# Altium integrated library Download.IntLib: 186 symbols
Pins are listed as number, name and electrical type; pins without a type are passive.

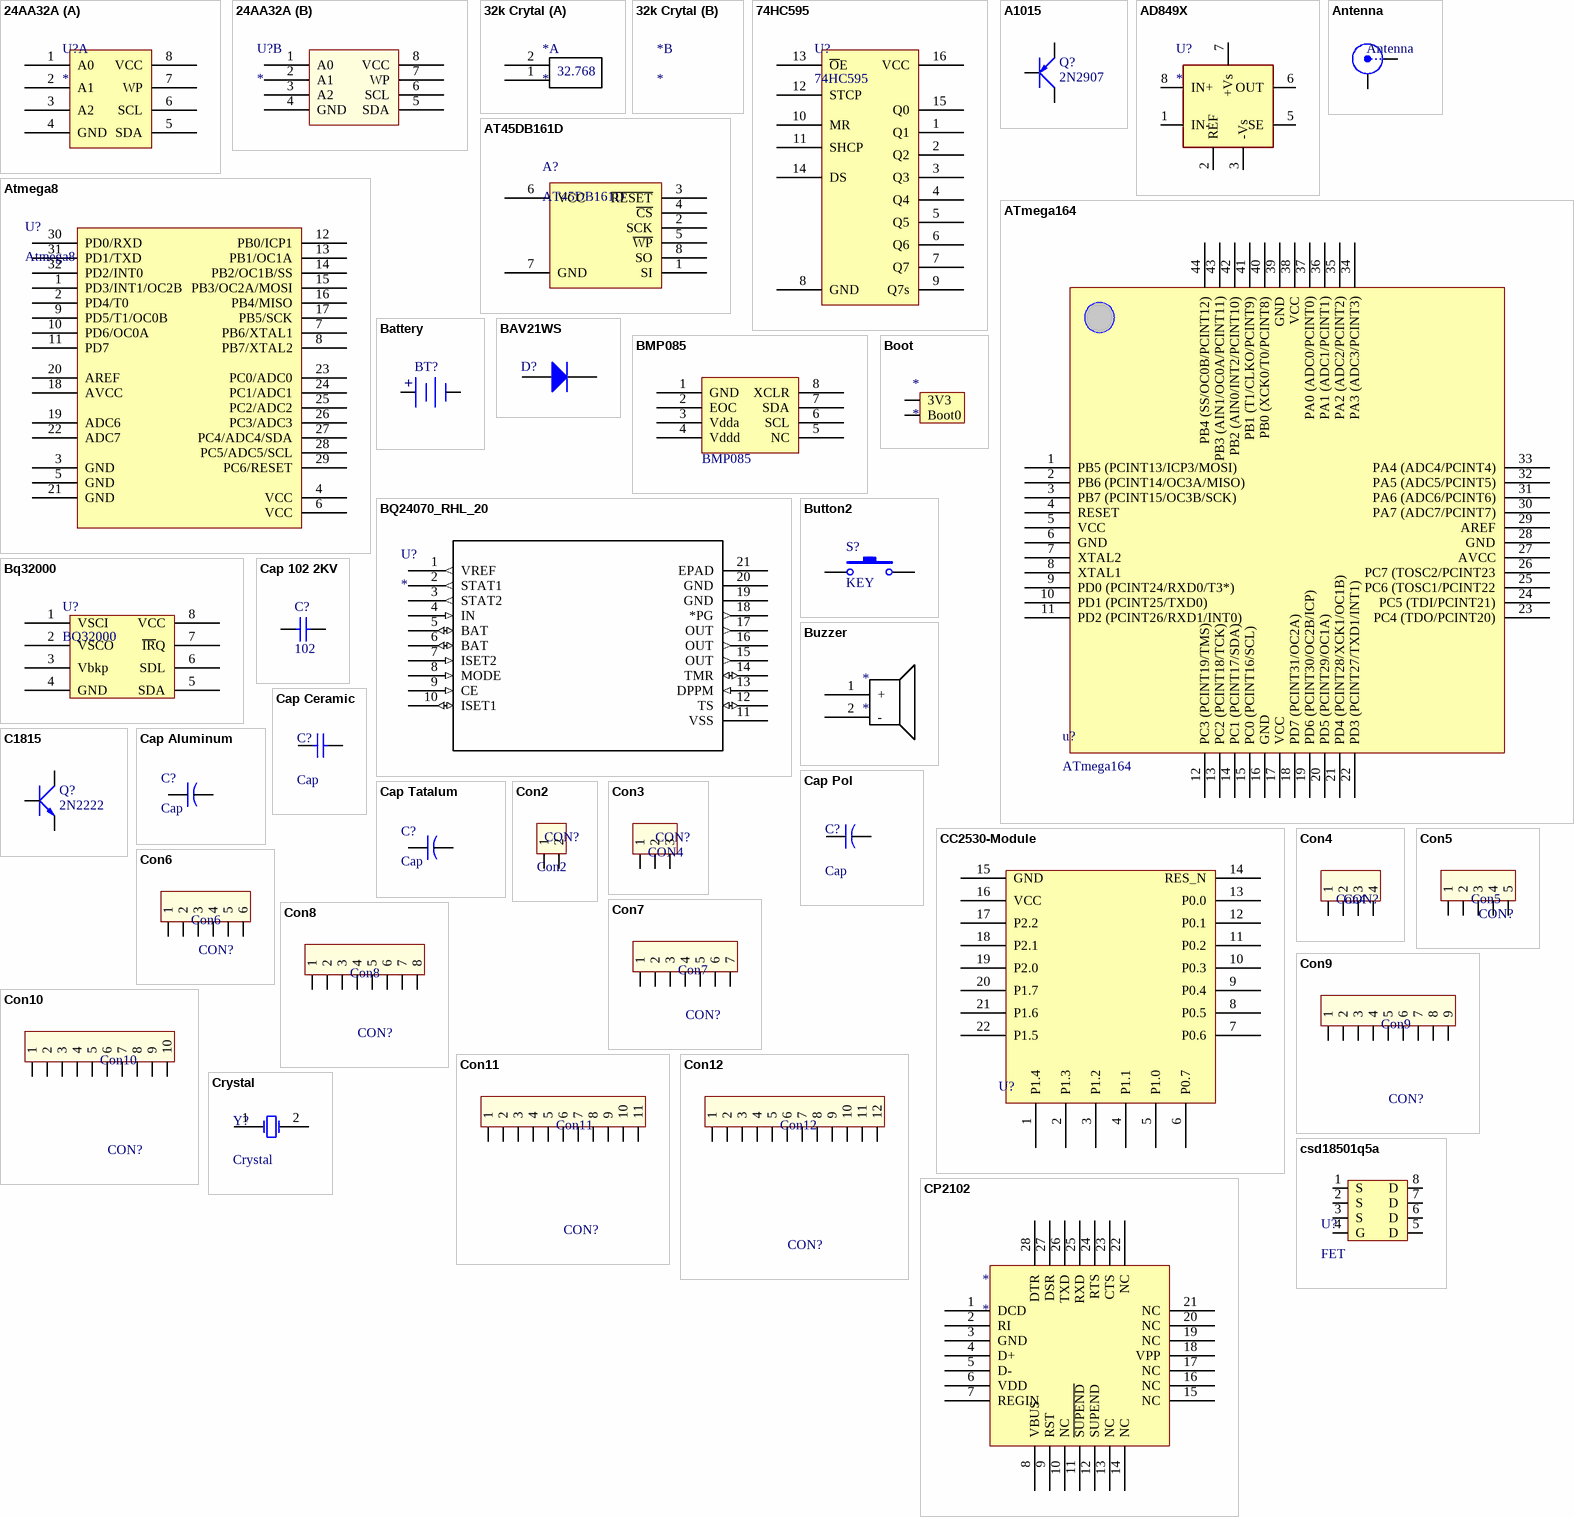
[diagram p0: symbols 24AA32A to csd18501q5a]

## 24AA32A
designator U?
part A pins: 1 A0, 2 A1, 3 A2, 4 GND, 5 SDA, 6 SCL, 7 WP, 8 VCC
part B pins: 1 A0, 2 A1, 3 A2, 4 GND, 5 SDA, 6 SCL, 7 WP, 8 VCC

## 32k Crytal
designator *
footprint 2hole_3mm
part A pins: 1, 2
part A text: 32.768

## 74HC595
designator U?
footprint SOIC16 (Small Outline; 14 Leads; Body Width 3.9 mm; Pitch 1.27 mm)
pins: 1 Q1, 2 Q2, 3 Q3, 4 Q4, 5 Q5, 6 Q6, 7 Q7, 8 GND, 9 Q7s, 10 MR, 11 SHCP, 12 STCP, 13 ~{O}E, 14 DS, 15 Q0, 16 VCC

## A1015
designator Q?, comment 2N2907
PNP 600mW, ECB; Value: A1015
footprint SOT23B (SOT 23B)
pins: 1 E, 2 C, 3 B

## AD849X
designator U?
footprint SOP8 (SOIC, 8-Leads, Body 4.9x3.9mm, Pitch 1.27mm, IPC High Density)
footprint MSOP-8
pins: 1 IN-, 2 REF, 3 -Vs, 5 SE, 6 OUT, 7 +Vs, 8 IN+

## Antenna
designator Antenna  (value not drawn)
LatestRevisionDate: 17-Jul-2002; LatestRevisionNote: Re-released for DXP Platform.; Publisher: Altium Limited
footprint IPX5 (Connector; Plug)
footprint RF_con
pins: 1 X, 2 Y

## AT45DB161D
designator A?
footprint SOIC8-8S2 (8-Pin Small Outline Integrated Circuit 1.27 mm Pitch, IPC Medium Density)
pins: 1 SI, 2 SCK, 3 ~{RESET}, 4 ~{CS}, 5 ~{WP}, 6 VCC, 7 GND, 8 SO

## Atmega8
designator U?
footprint Quad32
pins: 1 PD3/INT1/OC2B, 2 PD4/T0, 3 GND (power), 4 VCC, 5 GND (power), 6 VCC, 7 PB6/XTAL1, 8 PB7/XTAL2, 9 PD5/T1/OC0B, 10 PD6/OC0A, 11 PD7, 12 PB0/ICP1, 13 PB1/OC1A, 14 PB2/OC1B/SS, 15 PB3/OC2A/MOSI, 16 PB4/MISO, 17 PB5/SCK, 18 AVCC, 19 ADC6, 20 AREF, 21 GND (power), 22 ADC7, 23 PC0/ADC0, 24 PC1/ADC1, 25 PC2/ADC2, 26 PC3/ADC3, 27 PC4/ADC4/SDA, 28 PC5/ADC5/SCL, 29 PC6/RESET, 30 PD0/RXD, 31 PD1/TXD, 32 PD2/INT0

## ATmega164
designator u?
8-bit Atmel   Microcontroller   with   16/32/64/128K   Bytes In-System  Programmable   Flash
footprint TQFP44 (Atmega164)
pins: 1 PB5 (PCINT13/ICP3/MOSI) , 2 PB6 (PCINT14/OC3A/MISO) , 3 PB7 (PCINT15/OC3B/SCK), 4 RESET, 5 VCC, 6 GND, 7 XTAL2, 8 XTAL1, 9 PD0 (PCINT24/RXD0/T3*) , 10 PD1 (PCINT25/TXD0) , 11 PD2 (PCINT26/RXD1/INT0) , 12 PC3 (PCINT19/TMS) , 13 PC2 (PCINT18/TCK) , 14 PC1 (PCINT17/SDA), 15 PC0 (PCINT16/SCL) , 16 GND, 17 VCC, 18 PD7 (PCINT31/OC2A), 19 PD6 (PCINT30/OC2B/ICP) , 20 PD5 (PCINT29/OC1A), 21 PD4 (PCINT28/XCK1/OC1B) , 22 PD3 (PCINT27/TXD1/INT1), 23 PC4 (TDO/PCINT20), 24 PC5 (TDI/PCINT21), 25 PC6 (TOSC1/PCINT22, 26 PC7 (TOSC2/PCINT23, 27 AVCC, 28 GND, 29 AREF, 30 PA7 (ADC7/PCINT7), 31 PA6 (ADC6/PCINT6), 32 PA5 (ADC5/PCINT5), 33 PA4 (ADC4/PCINT4), 34 PA3 (ADC3/PCINT3), 35 PA2 (ADC2/PCINT2), 36 PA1 (ADC1/PCINT1), 37 PA0 (ADC0/PCINT0), 38 VCC, 39 GND, 40 PB0 (XCK0/T0/PCINT8), 41 PB1 (T1/CLKO/PCINT9), 42 PB2 (AIN0/INT2/PCINT10), 43 PB3 (AIN1/OC0A/PCINT11), 44 PB4 (SS/OC0B/PCINT12)

## Battery
designator BT?
Multicell Battery; Published: 24-Mar-1999; LatestRevisionDate: 17-Jul-2002; LatestRevisionNote: Re-released for DXP Platform.; PackageReference: BAT-2; Publisher: Altium Limited; PackageDescription: Battery; 2 Leads
footprint Battery CMOS (4.8mm)
footprint CR1220-smd (Pin)
pins: 1 -, 2 +

## BAV21WS
designator D?
Default Diode; Published: 8-Jun-2000; LatestRevisionDate: 17-Jul-2002; LatestRevisionNote: Re-released for DXP Platform.; PackageVersion: Sep-1996; PackageReference: SMC; Publisher: Altium Limited; PackageDescription: DO-214-AB/SMC; 2 C-Bend Leads; Body 7.9 x 5.9 mm, inc. leads (LxW); Code_JEDEC: DO-214-AB
footprint Diode1206
pins: 1 A, 2 K

## BMP085
designator U?
footprint BMP085
pins: 1 GND (power), 2 EOC, 3 Vdda (power), 4 Vddd (power), 5 NC, 6 SCL, 7 SDA, 8 XCLR

## Boot
designator *
footprint Boot0
pins: 1 Boot0, 2 3V3

## BQ24070_RHL_20
designator U?
Imported; Manufacturer: Texas Instruments; GENERIC_PART_NUMBER: BQ24070; INDUSTRY_STD_PKG_TYPE: QFN; FAMILY_NAME: BATTERY CHARGE MANAGEMENT; PIN_COUNT: 20; PACKAGE_DESIGNATOR: RHL; Datasheet URL: http://www.ti.com/lit/gpn/BQ24070; RefDes: RefDes; Type: DEV; Value: Value
footprint RHL20_2P05X3P05
pins: 1 VREF (out), 2 STAT1 (out), 3 STAT2 (out), 4 IN (in), 5 BAT (io), 6 BAT (io), 7 ISET2 (in), 8 MODE (in), 9 CE (in), 10 ISET1 (io), 11 VSS (power), 12 TS (io), 13 DPPM (in), 14 TMR (io), 15 OUT (out), 16 OUT (out), 17 OUT (out), 18 *PG (out), 19 GND (power), 20 GND (power), 21 EPAD

## Bq32000
designator U?, comment BQ32000
footprint SOP8 (SOIC, 8-Leads, Body 4.9x3.9mm, Pitch 1.27mm, IPC High Density)
pins: 1 VSCI, 2 VSCO, 3 Vbkp, 4 GND, 5 SDA, 6 SDL, 7 ~{IR}Q, 8 VCC

## Button2
designator S?, comment KEY
Button
footprint SW-SMD (Switch SMD type)
pins: 1, 2

## Buzzer
designator *
footprint BUZZER_12.0X8.5MM
footprint Buzzer
pins: 1 +, 2 -

## C1815
designator Q?, comment 2N2222
NPN 600mW, ECB; Value: C1815
footprint SOT23B (SOT 23B)
pins: 1 E, 2 C, 3 B

## Cap 102 2KV
designator C?, comment 102
Capacitor (Semiconductor SIM Model); Value: 0.1uF; Published: 8-Jun-2000; LatestRevisionDate: 17-Jul-2002; LatestRevisionNote: Re-released for DXP Platform.; PackageReference: C1206; Publisher: Altium Limited
footprint CAP102 2KV (Capacitor, Ceramic, Thru-Hole, Dipped Radial; Body 5.1 x 3.2 mm (WxT) Pin Spacing 2.54 mm (typ))
pins: 1, 2

## Cap Aluminum
designator C?, comment Cap
Capacitor
footprint CAP-D8-220uF/16V (6.3 x 7.7 mm)
footprint CAP-B-22UF/16V
pins: 1, 2

## Cap Ceramic
designator C?, comment Cap
Capacitor; Published: 8-Jun-2000; LatestRevisionDate: 17-Jul-2002; LatestRevisionNote: Re-released for DXP Platform.; PackageReference: RAD-0.3; Publisher: Altium Limited; PackageDescription: Radial Cap, Thru-Hole; 2 Leads; 0.3 in Pin Spacing
footprint CAP0603
footprint CAP0805
footprint CAP1206
pins: 1, 2

## Cap Pol
designator C?, comment Cap
Capacitor; Published: 23-Sep-2002; PackageReference: CAPR5-4X5; Publisher: Altium Limited; PackageDescription: Capacitor; 2 Leads
footprint CP2/5 (Tu hoa 1000uF/25V,50V)
footprint Cap-Pol 8x12
pins: 1, 2

## Cap Tatalum
designator C?, comment Cap
Capacitor
footprint CAP1812 (Chip Capacitor; Body 4.5 x 3.2 mm (LxW typ))
footprint SM-Tanta-1206
footprint CAPMP-0805-2012X150USR (Molded body capacitor, Body 2.0x1.2mm, 0805, IPC Medium Density)
footprint CAPMP-1206-3216X180N (Capacitor, polarized, Molded Body, EIA 535BAAC size A; 3.20mm L X 1.60mm W X 1.80mm H)
footprint CAPMP-1210-3528X210N (Molded body capacitor, Body 3.5x2.8mm, 1210, IPC Nominal settings)
footprint CAPMP-2312-6032X280N (Capacitor, polarized, Molded Body, EIA 535BAAC size C; 6.00mm L X 3.20mm W X 2.80mm H)
footprint CAPMP-2917-7343X310N (Molded body capacitor, Body 7.3x4.3mm, 2917, IPC Nominal settings)
pins: 1, 2

## CC2530-Module
designator U?, comment U  (value not drawn)
pins: 1 P1.4, 2 P1.3, 3 P1.2, 4 P1.1, 5 P1.0, 6 P0.7, 7 P0.6, 8 P0.5, 9 P0.4, 10 P0.3, 11 P0.2, 12 P0.1, 13 P0.0, 14 RES_N, 15 GND, 16 VCC, 17 P2.2, 18 P2.1, 19 P2.0, 20 P1.7, 21 P1.6, 22 P1.5

## Con2
designator CON?
JST B2B - CONNECTOR, HEADER, 2.5MM, 2POS, 1ROW-(JAPAN SOLDERLESS TERMINALS); Value: Connector 2
footprint CON2
footprint TERMIN SINO
pins: 1, 2

## Con3
designator CON?, comment CON4
JST B3B - CONNECTOR, HEADER, 2.5MM, 3POS, 1ROW-(JAPAN SOLDERLESS TERMINALS); Value: Connector 3
footprint CON3 (CON 3)
pins: 1, 2, 3

## Con4
designator CON?
JST B4B - CONNECTOR, HEADER, 2.5MM, 4POS, 1ROW-(JAPAN SOLDERLESS TERMINALS); Value: Connector 4
footprint CON4
pins: 1, 2, 3, 4

## Con5
designator CON?
JST B5B - CONNECTOR, HEADER, 2.5MM, 5POS, 1ROW-(JAPAN SOLDERLESS TERMINALS); Value: Connector 5
footprint CON5
pins: 1, 2, 3, 4, 5

## Con6
designator CON?
JST B6B - CONNECTOR, HEADER, 2.5MM, 6POS, 1ROW-(JAPAN SOLDERLESS TERMINALS); Value: Connector 6
footprint CON6
pins: 1, 2, 3, 4, 5, 6

## Con7
designator CON?
JST B7B - CONNECTOR, HEADER, 2.5MM, 7POS, 1ROW-(JAPAN SOLDERLESS TERMINALS); Value: Connector 7
footprint CON7
pins: 1, 2, 3, 4, 5, 6, 7

## Con8
designator CON?
JST B8B - CONNECTOR, HEADER, 2.5MM, 8POS, 1ROW-(JAPAN SOLDERLESS TERMINALS); Value: Connector 8
footprint CON8
pins: 1, 2, 3, 4, 5, 6, 7, 8

## Con9
designator CON?
JST B9B - CONNECTOR, HEADER, 2.5MM, 9POS, 1ROW-(JAPAN SOLDERLESS TERMINALS); Value: Connector 9
footprint CON9
pins: 1, 2, 3, 4, 5, 6, 7, 8, 9

## Con10
designator CON?
JST B10B - CONNECTOR, HEADER, 2.5MM, 10POS, 1ROW-(JAPAN SOLDERLESS TERMINALS); Value: Connector 10
footprint CON10
pins: 1, 2, 3, 4, 5, 6, 7, 8, 9, 10

## Con11
designator CON?
JST B11B - CONNECTOR, HEADER, 2.5MM, 11POS, 1ROW-(JAPAN SOLDERLESS TERMINALS); Value: Connector 11
footprint CON11
pins: 1, 2, 3, 4, 5, 6, 7, 8, 9, 10, 11

## Con12
designator CON?
JST B12B - CONNECTOR, HEADER, 2.5MM, 12POS, 1ROW-(JAPAN SOLDERLESS TERMINALS); Value: Connector 12
footprint CON12
pins: 1, 2, 3, 4, 5, 6, 7, 8, 9, 10, 11, 12

## CP2102
designator *
footprint CP2102 (QFN, 28-Leads, Body 4.80x4.80mm, Pitch 0.50mm, Thermal Pad 3.30x3.30mm, IPC Medium Density)
pins: 1 DCD, 2 RI, 3 GND, 4 D+, 5 D-, 6 VDD, 7 REGIN, 8 VBUS, 9 RST, 10 NC, 11 ~{SUPEND}, 12 SUPEND, 13 NC, 14 NC, 15 NC, 16 NC, 17 NC, 18 VPP, 19 NC, 20 NC, 21 NC, 22 NC, 23 CTS, 24 RTS, 25 RXD, 26 TXD, 27 DSR, 28 DTR

## Crystal
designator Y?
Crystal Oscillator; Published: 8-Jun-2000; LatestRevisionDate: 17-Jul-2002; LatestRevisionNote: Re-released for DXP Platform.; PackageReference: R38; Publisher: Altium Limited; PackageDescription: Crystal, Thru-Hole; 2 Leads; Body 3.1 x 8.2 mm (Dia.xH)
footprint CRYSTAL_XT- 16MHz
footprint CRYSTAL_XT5032-8Mhz (Crystal)
footprint CRYSTAL_NX2520SA (SMD Crystal 4-lead leadless package)
footprint CRYSTAL_HC49-US-SM (SMD Crystal HC49/US-SM package)
footprint CRYSTAL_4-LCC (SMD Crystal 4-lead leadless package)
footprint XT2 (Footpin for Crystal 2 pin)
footprint 2hole_3mm
pins: 1 OSC1, 2 OSC2

## csd18501q5a
designator U?, comment FET
footprint csd18501q5a (FET)
pins: 1 S, 2 S, 3 S, 4 G, 5 D, 6 D, 7 D, 8 D

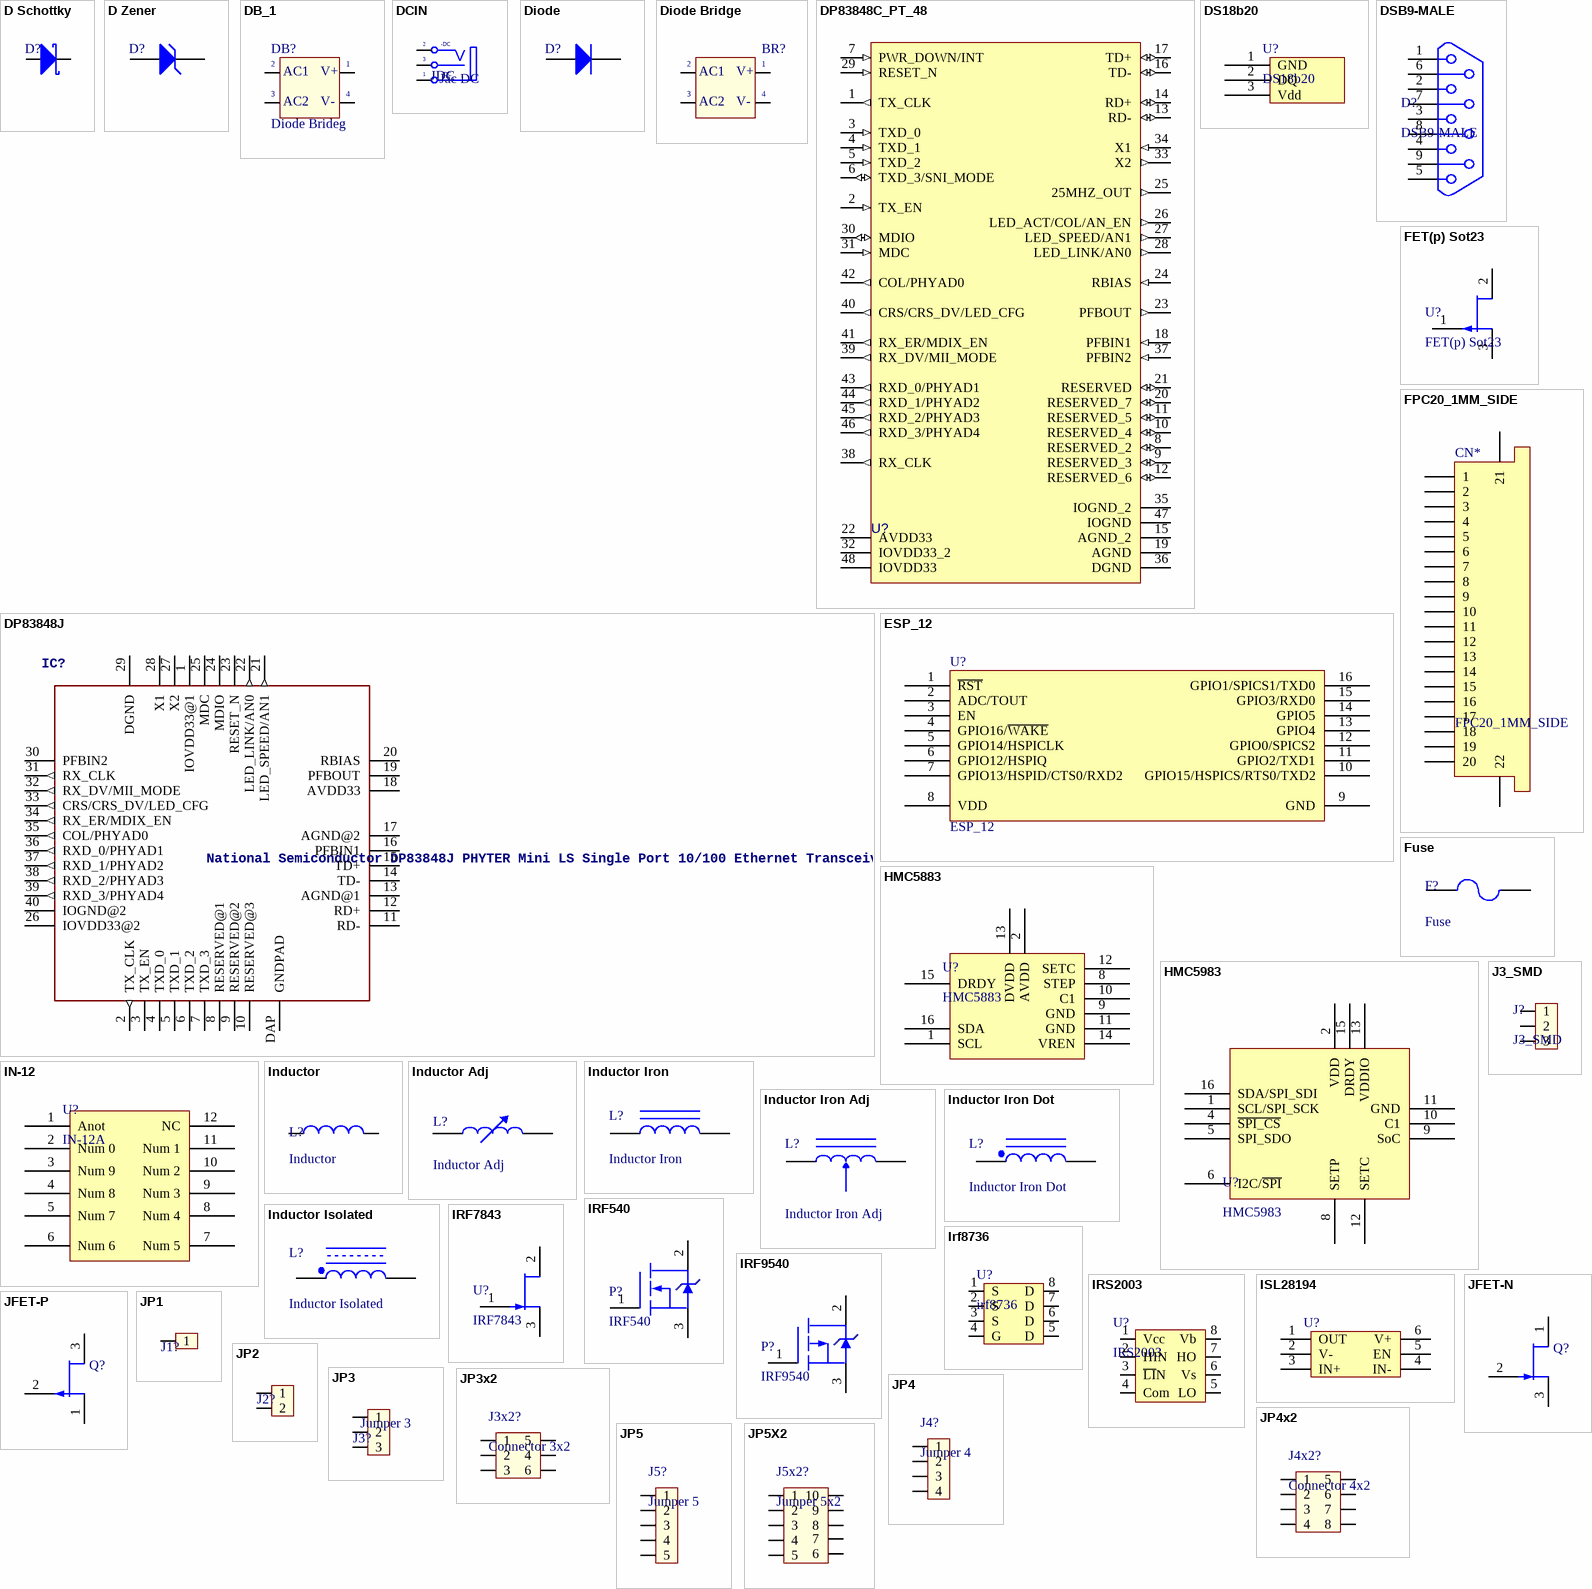
[diagram p1: symbols D Schottky to JP5X2]

## D Schottky
designator D?
Schottky Diode; Published: 8-Jun-2000; LatestRevisionDate: 17-Jul-2002; LatestRevisionNote: Re-released for DXP Platform.; PackageReference: SMB; Publisher: Altium Limited; PackageDescription: DO-214-AA/SMB; 2 C-Bend Leads; Body 5.3 x 3.6 mm, inc. leads (LxW); Code_JEDEC: DO-214-AA
footprint Diode1206
pins: 1 A, 2 K

## D Zener
designator D?
Zener Diode; Published: 8-Jun-2000; LatestRevisionDate: 17-Jul-2002; LatestRevisionNote: Re-released for DXP Platform.; PackageReference: DIODE-0.7; Publisher: Altium Limited; PackageDescription: Diode, Thru-Hole; 2 Leads; 0.7 in Pin Spacing
pins: 1 A, 2 K

## DB_1
designator DB?, comment Diode Brideg
Convert AC to DC voltage, 4 pin; Value: Cau 1A
footprint CAU 1A (CAU 1A DET)
footprint CAU 5A (CAU 5A DET)
footprint Cau 10A (CAU 10A det)
footprint CAU 1AC (CAU 1A TRON)
pins: 1 +V OUT, 2 AC1, 3 AC2, 4 -V OUT
text: V+; V-

## DCIN
designator JDC, comment Jac DC
Jac DC input; Value: Jac DC
footprint DC-IN (Jac DC input)
pins: 1 T "Tip", 2 TN "Tip Normal (Break Contact)", 3 S (power) "Sleeve (Ground)"
text: -DC; +DC

## Diode
designator D?
Default Diode; Published: 8-Jun-2000; LatestRevisionDate: 17-Jul-2002; LatestRevisionNote: Re-released for DXP Platform.; PackageVersion: Sep-1996; PackageReference: SMC; Publisher: Altium Limited; PackageDescription: DO-214-AB/SMC; 2 C-Bend Leads; Body 7.9 x 5.9 mm, inc. leads (LxW); Code_JEDEC: DO-214-AB
footprint Diode1206
footprint DIODE-M7 (Metal Electrode Face (MELF) Diode; Body 3.5 x 1.5 mm (LxDia))
footprint DO-214AC (JEDEC DO214 variation AC. SMA ( Diode M7 ))
footprint DO-214AB (JEDEC DO214 variation AB. SMC ( Diode SS34 ))
footprint DO-214AA (JEDEC DO214 variation AA. SMB)
pins: 1 A, 2 K

## Diode Bridge
designator BR?, comment BR  (value not drawn)
Convert AC to DC voltage, 4 pin; Value: Cau 1A
footprint DB 1A (CAU 1A DET)
footprint DB 1AC (CAU 1A TRON)
footprint DB 5A (CAU 5A DET)
footprint DB-S4 (SOT143, 4-Leads, Body 8.50x10.50mm, Pitch 5.20mm, IPC Medium Density)
pins: 1 +V OUT, 2 AC1, 3 AC2, 4 -V OUT
text: V+; V-

## DP83848C_PT_48
designator U?  (value not drawn)
PartNumber: DP83848CVV; Manufacturer: NationalSemiconductor; PackageTopMarking: NSUZXYTTDP83848VVVBC; PowerWise: N; CompType: InterfaceIC; ComponentLink1DescBC: DP83848CDatasheet; ComponentLink2DescA4: DP83848CWebPage; ComponentLink3DescAC: VBH48APackagePage; Published: 4-Dec-2008; DatasheetVersion: May-2008; PackageVersion: revEMay-2007; PackageReference: VBH48A; Publisher: AltiumLimited; PackageDescription: LQFP7x7x14mm48Lead05mmPitch; SUPPLIER_3: 1Farnell; SUPPLIER_2: PartNumb0C1286816; SUPPLIER_4: 2Farnell; Supplier: PartNumb0F1528379; RoHS: Y; PinCount: 48; ComponentLink1URL: http//wwwnationalcom/ds/DP/DP83848Cpdf; ComponentLink2URL: http//wwwnationalcom/pf/DP/DP83848Chtml; ComponentLink3URL: http//wwwnationalcom/packaging/folders/vbh48ahtml; Value: DP83848C_PT_48
footprint DP83848C_48 (Thin QFP, 48-Leads, Body 7x7mm, Pitch 0.5mm, IPC High Density)
pins: 1 TX_CLK (out), 2 TX_EN (in), 3 TXD_0 (in), 4 TXD_1 (in), 5 TXD_2 (in), 6 TXD_3/SNI_MODE (io), 7 PWR_DOWN/INT (in), 8 RESERVED_2 (io), 9 RESERVED_3 (io), 10 RESERVED_4 (io), 11 RESERVED_5 (io), 12 RESERVED_6 (io), 13 RD- (io), 14 RD+ (io), 15 AGND_2 (power), 16 TD- (io), 17 TD+ (io), 18 PFBIN1 (in), 19 AGND (power), 20 RESERVED_7 (io), 21 RESERVED (io), 22 AVDD33 (power), 23 PFBOUT (out), 24 RBIAS (in), 25 25MHZ_OUT (out), 26 LED_ACT/COL/AN_EN (out), 27 LED_SPEED/AN1 (out), 28 LED_LINK/AN0 (out), 29 RESET_N (in), 30 MDIO (io), 31 MDC (in), 32 IOVDD33_2 (power), 33 X2 (out), 34 X1 (in), 35 IOGND_2 (power), 36 DGND (power), 37 PFBIN2 (in), 38 RX_CLK (out), 39 RX_DV/MII_MODE (out), 40 CRS/CRS_DV/LED_CFG (out), 41 RX_ER/MDIX_EN (out), 42 COL/PHYAD0 (out), 43 RXD_0/PHYAD1 (out), 44 RXD_1/PHYAD2 (out), 45 RXD_2/PHYAD3 (out), 46 RXD_3/PHYAD4 (out), 47 IOGND (power), 48 IOVDD33 (power)

## DP83848J
designator IC?, comment National Semiconductor DP83848J PHYTER Mini LS Single Port 10/100 Ethernet Transceiver
footprint LLP-40
pins: 1 IOVDD33@1 (power), 2 TX_CLK (out), 3 TX_EN, 4 TXD_0, 5 TXD_1, 6 TXD_2, 7 TXD_3, 8 RESERVED@1, 9 RESERVED@2, 10 RESERVED@3, 11 RD-, 12 RD+, 13 AGND@1 (power), 14 TD-, 15 TD+, 16 PFBIN1, 17 AGND@2 (power), 18 AVDD33 (power), 19 PFBOUT, 20 RBIAS, 21 LED_SPEED/AN1 (out), 22 LED_LINK/AN0 (out), 23 RESET_N, 24 MDIO, 25 MDC, 26 IOVDD33@2 (power), 27 X2, 28 X1, 29 DGND (power), 30 PFBIN2, 31 RX_CLK (out), 32 RX_DV/MII_MODE (out), 33 CRS/CRS_DV/LED_CFG (out), 34 RX_ER/MDIX_EN (out), 35 COL/PHYAD0 (out), 36 RXD_0/PHYAD1 (out), 37 RXD_1/PHYAD2 (out), 38 RXD_2/PHYAD3 (out), 39 RXD_3/PHYAD4 (out), 40 IOGND@2 (power), DAP GNDPAD (power)

## DS18b20
designator U?
footprint TO-92(3)
pins: 1 GND, 2 DQ, 3 Vdd

## DSB9-MALE
designator D?
footprint DSB 9-M (COM MALE D Subminiature; 9 Position; Right Angle; Pitch 1.385 mm)
pins: 1, 2, 3, 4, 5, 6, 7, 8, 9

## ESP_12
designator U?
ESP-12 Wi-Fi Module by AI-Thinker; IC: ESP8266-EX; Vendor: Ai-thinker
footprint ESP_12 (ESP-12 Wi-Fi Module by AI-Thinker)
pins: 1 ~{RST} "Reset", 2 ADC/TOUT "ADC Input Or TOUT Output", 3 EN "Chip enable", 4 GPIO16/~{WAKE} "GPIO16 or Deep-Sleep Wakeup", 5 GPIO14/HSPICLK "GPIO14 or SPI CLK", 6 GPIO12/HSPIQ "GPIO12 or SPIQ", 7 GPIO13/HSPID/CTS0/RXD2 "GPIO13 or SPID", 8 VDD "Power supply", 9 GND "Power ground", 10 GPIO15/HSPICS/RTS0/TXD2 "GPIO15 or SPICS", 11 GPIO2/TXD1 "GPIO2 or TX", 12 GPIO0/SPICS2 "GPIO0 or SPICS2", 13 GPIO4 "GPIO5", 14 GPIO5 "GPIO4", 15 GPIO3/RXD0 "GPIO3 or UART RXD", 16 GPIO1/SPICS1/TXD0 "GPIO1 or UART TXD"

## FET(p) Sot23
designator U?
footprint 2N2222 (SOT 23B)
pins: 1 G, 2 S, 3 D

## FPC20_1MM_SIDE
designator CN*
FPC Socket, 1mm pitch, 20-Pin, Side Mount; LatestRevisionDate: 17-Jul-2002; LatestRevisionNote: Re-released for DXP Platform.; Publisher: Altium Limited
footprint FPC20_1MM_SIDE (FPC Socket, 1mm pitch, 20-Pin, Side Mount)
pins: 1, 2, 3, 4, 5, 6, 7, 8, 9, 10, 11, 12, 13, 14, 15, 16, 17, 18, 19, 20, 21, 22

## Fuse
designator F?
Published: 8-Jun-2000; LatestRevisionDate: 17-Jul-2002; LatestRevisionNote: Re-released for DXP Platform.; PackageReference: PIN-W2/E2.8; Publisher: Altium Limited; PackageDescription: Thru-Hole; 2 Leads
footprint Fuse (SMD-1812)
pins: 1, 2

## HMC5883
designator U?
3-Axis Digital Compass IC
footprint HMC5883
pins: 1 SCL, 2 AVDD, 3 NC hidden, 4 NC hidden, 5 NC hidden, 6 NC hidden, 7 NC hidden, 8 STEP, 9 GND, 10 C1, 11 GND, 12 SETC, 13 DVDD, 14 VREN, 15 DRDY, 16 SDA

## HMC5983
designator U?
3-Axis Digital Compass IC
footprint HMC5983 (QFN, 16-Leads, Body 3.00x3.00mm, Pitch 0.20mm, Thermal Pad 1.40x1.80mm, IPC Medium Density)
pins: 1 SCL/SPI_SCK, 2 VDD, 4 ~{SPI_CS}, 5 SPI_SDO, 6 I2C/~{SPI}, 8 SETP, 9 SoC, 10 C1, 11 GND, 12 SETC, 13 VDDIO, 15 DRDY, 16 SDA/SPI_SDI

## IN-12
designator U?, comment IN-12A
footprint IN-12 (Nixie tube)
pins: 1 Anot, 2 Num 0, 3 Num 9, 4 Num 8, 5 Num 7, 6 Num 6, 7 Num 5, 8 Num 4, 9 Num 3, 10 Num 2, 11 Num 1, 12 NC

## Inductor
designator L?
Code_IEC: 1005; Published: 8-Jun-2000; LatestRevisionDate: 29-May-2009; LatestRevisionNote: IPC-7351 Footprint Added.; PackageReference: 0402-A; Publisher: Altium Limited; PackageDescription: Chip Inductor; Code_JEITA: 0402
footprint L0805
footprint INDUCTOR 8D43
footprint IND_WW_DR73 (Wire-wound power inductor, Cooper Bussmann DR73 series, IPC Medium Density)
footprint INDUCTOR12x12 (12x12mm)
footprint DIP-INDUCTOR
pins: 1, 2

## Inductor Adj
designator L?
Adjustable Inductor; Set Position: 0.5; Published: 24-Mar-1999; LatestRevisionDate: 17-Jul-2002; LatestRevisionNote: Re-released for DXP Platform.; PackageReference: AXIAL-0.8; Publisher: Altium Limited; PackageDescription: Axial Device, Thru-Hole; 2 Leads; 0.8 in Pin Spacing
pins: 1, 2

## Inductor Iron
designator L?
Magnetic-Core Inductor; Published: 24-Mar-1999; LatestRevisionDate: 17-Jul-2002; LatestRevisionNote: Re-released for DXP Platform.; PackageReference: AXIAL-0.9; Publisher: Altium Limited; PackageDescription: Axial Device, Thru-Hole; 2 Leads; 0.9 in Pin Spacing
pins: 1, 2

## Inductor Iron Adj
designator L?
Adjustable Magnetic-Core Inductor; Set Position: 0.5; Published: 24-Mar-1999; LatestRevisionDate: 17-Jul-2002; LatestRevisionNote: Re-released for DXP Platform.; PackageReference: AXIAL-1.0; Publisher: Altium Limited; PackageDescription: Axial Device, Thru-Hole; 2 Leads; 1.0 in Pin Spacing
pins: 1, 2

## Inductor Iron Dot
designator L?
Magnetic-Core Inductor with Winding Polarity Marking; Published: 24-Mar-1999; LatestRevisionDate: 17-Jul-2002; LatestRevisionNote: Re-released for DXP Platform.; PackageReference: DIODE_SMC; Publisher: Altium Limited; PackageDescription: Diode; 2 Leads
pins: 1, 2

## Inductor Isolated
designator L?
Isolated Inductor; Published: 24-Mar-1999; LatestRevisionDate: 17-Jul-2002; LatestRevisionNote: Re-released for DXP Platform.; PackageVersion: 1988; PackageReference: 425; Publisher: Altium Limited; PackageDescription: SOD-123; 2 Leads; Body 2.7 x 1.6 mm, (LxW)
pins: 1, 2

## IRF540
designator P?
footprint TO-220
pins: 1 G, 2 D, 3 S

## IRF7843
designator U?
footprint TO252
pins: 1 G, 2 D, 3 S

## Irf8736
designator U?, comment irf8736
footprint SO-8
pins: 1 S, 2 S, 3 S, 4 G, 5 D, 6 D, 7 D, 8 D

## IRF9540
designator P?
footprint TO-220
pins: 1 G, 2 D, 3 S

## IRS2003
designator U?
footprint SO-8
pins: 1 Vcc, 2 HIN, 3 ~{LI}N, 4 Com, 5 LO, 6 Vs, 7 HO, 8 Vb

## ISL28194
designator U?  (value not drawn)
footprint SOT23-6
pins: 1 OUT, 2 V-, 3 IN+, 4 IN-, 5 EN, 6 V+

## J3_SMD
designator J?
footprint J3_SMD (Pitch 1.27)
pins: 1, 2, 3

## JFET-N
designator Q?
N-Channel JFET; Published: 8-Jun-2000; LatestRevisionDate: 17-Jul-2002; LatestRevisionNote: Re-released for DXP Platform.; PackageReference: TO-254-AA; Publisher: Altium Limited; Code_JEDEC: TO-254-AA
pins: 1 D, 2 G, 3 S

## JFET-P
designator Q?
P-Channel JFET; Published: 8-Jun-2000; LatestRevisionDate: 17-Jul-2002; LatestRevisionNote: Re-released for DXP Platform.; PackageReference: TO-18A; Publisher: Altium Limited; PackageDescription: SC-89; 3 Flat Leads; Body 1.6 x 1.6 x 0.7 mm, inc leads (LxWxH typ)
pins: 1 D, 2 G, 3 S

## JP1
designator J1?, comment Jumper 1  (value not drawn)
Value: JP 2
footprint JP1
pins: 1

## JP2
designator J2?, comment Jumper 2  (value not drawn)
Value: JP 2
footprint JP2
footprint CON2
footprint HED2T (Header 2, 2 pin, hight 300mil, Pin to Pin 200, Colour Green)
footprint HED2T-H (Header 2, 2 pin, hight 300mil, Pin to Pin 200, Colour Green)
pins: 1, 2

## JP3
designator J3?, comment Jumper 3
Value: J3
footprint JP3 (Jumper 3)
footprint JP3H
footprint Header 3 1.5mm
footprint CON3 (CON 3)
footprint Header 3 50mil - duplicate (Connector; Header; 4 Position)
pins: 1, 2, 3

## JP3x2
designator J3x2?, comment Connector 3x2
Value: Connector 3x2
footprint JP3x2 (Connector 3x2)
pins: 1, 2, 3, 4, 5, 6

## JP4
designator J4?, comment Jumper 4
footprint JP4 (Jumper 4)
footprint JP4H
footprint Header 4 50mil (Connector; Header; 4 Position)
footprint CON4
pins: 1, 2, 3, 4

## JP4x2
designator J4x2?, comment Connector 4x2
Value: Connector 4x2
footprint JP4x2 (Connector 4x2)
pins: 1, 2, 3, 4, 5, 6, 7, 8

## JP5
designator J5?, comment Jumper 5
footprint JP5
footprint JP5H
footprint Header 5 50mil
footprint CON5
footprint JP5 - Gold (JP5)
pins: 1, 2, 3, 4, 5

## JP5X2
designator J5x2?, comment Jumper 5x2
footprint JP5X2
pins: 1, 2, 3, 4, 5, 6, 7, 8, 9, 10

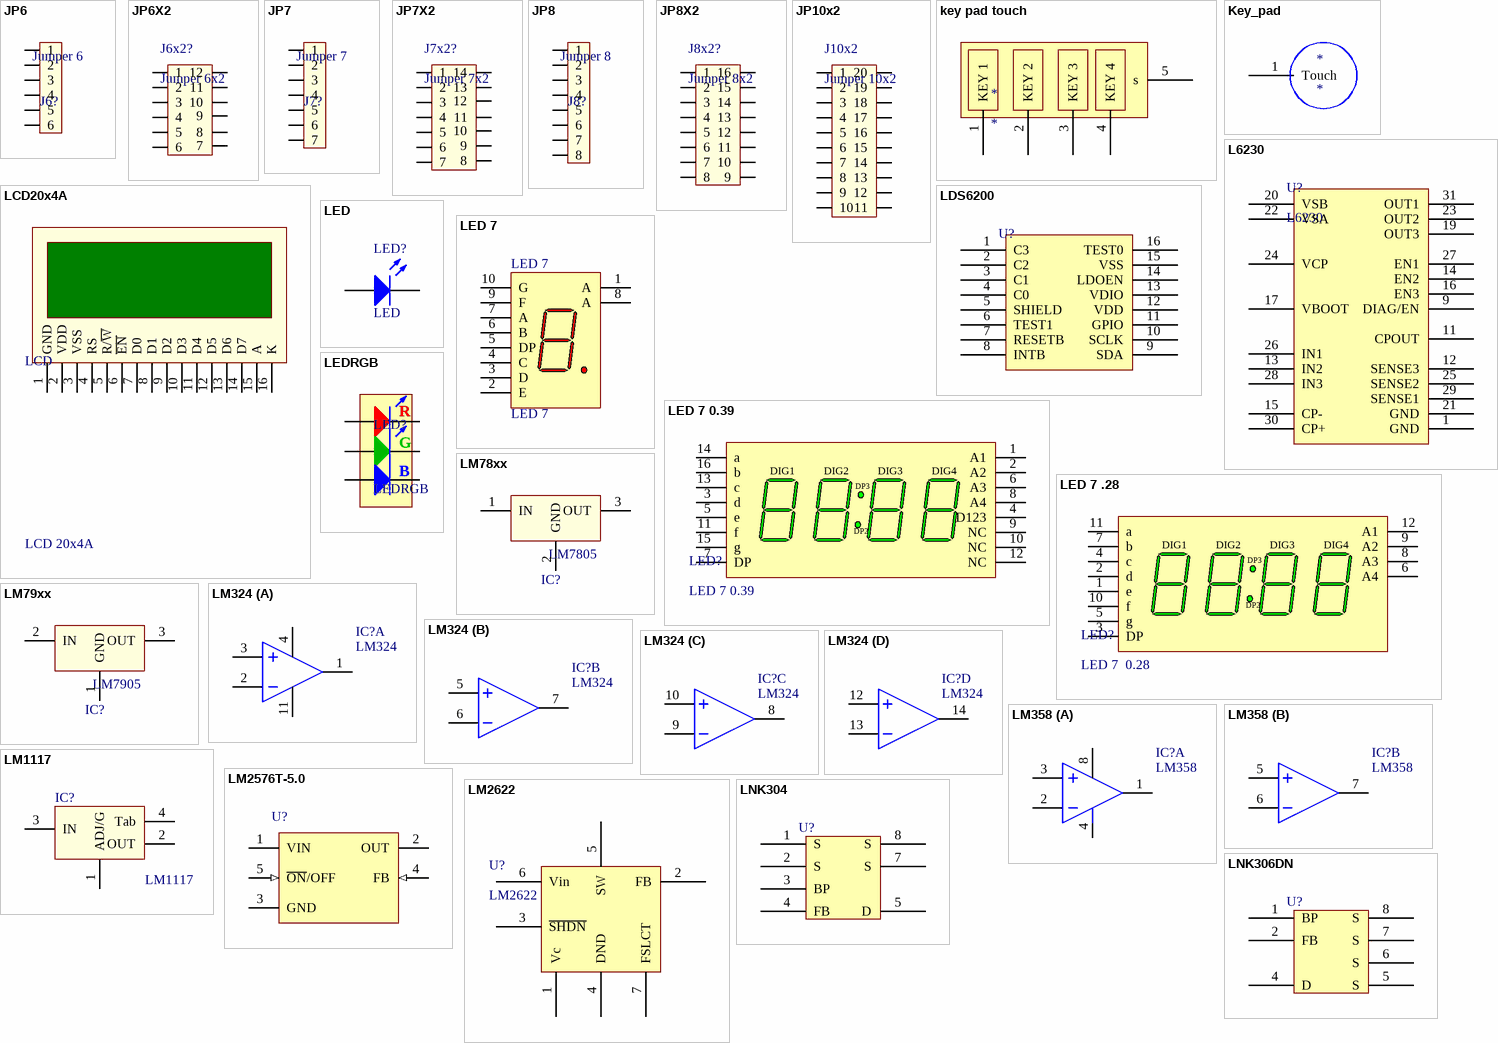
[diagram p2: symbols JP6 to LNK306DN]

## JP6
designator J6?, comment Jumper 6
Value: JP7
footprint JP6
footprint JP6H
footprint Header 6 50mil
footprint CON6
pins: 1, 2, 3, 4, 5, 6

## JP6X2
designator J6x2?, comment Jumper 6x2
footprint JP6X2
pins: 1, 2, 3, 4, 5, 6, 7, 8, 9, 10, 11, 12

## JP7
designator J7?, comment Jumper 7
Value: JP7
footprint JP7
footprint JP7H
footprint CON7
pins: 1, 2, 3, 4, 5, 6, 7

## JP7X2
designator J7x2?, comment Jumper 7x2
footprint JP7X2
pins: 1, 2, 3, 4, 5, 6, 7, 8, 9, 10, 11, 12, 13, 14

## JP8
designator J8?, comment Jumper 8
Value: JP7
footprint JP8
footprint JP8H
footprint CON8
footprint Header 8 50mil
pins: 1, 2, 3, 4, 5, 6, 7, 8

## JP8X2
designator J8x2?, comment Jumper 8x2
footprint JP8X2
pins: 1, 2, 3, 4, 5, 6, 7, 8, 9, 10, 11, 12, 13, 14, 15, 16

## JP10x2
designator J10x2, comment Jumper 10x2
footprint JP10X2H
footprint JP10X2FM
footprint JP10X2H
pins: 1, 2, 3, 4, 5, 6, 7, 8, 9, 10, 11, 12, 13, 14, 15, 16, 17, 18, 19, 20

## key pad touch
designator *
footprint 4KEYTOUCH
pins: 1 KEY 1, 2 KEY 2, 3 KEY 3, 4 KEY 4, 5 s

## Key_pad
designator *
footprint TOUCH_Key_10mm
pins: 1 Touch

## L6230
designator U?
DMOS driver for three-phase brushless DC motor
footprint L2630 (QFN, 32-Leads, Body 5.00x5.00mm, Pitch 0.50mm, Thermal Pad 4.00x2.20mm, IPC Medium Density)
pins: 1 GND, 2 NC hidden, 3 NC hidden, 4 NC hidden, 5 NC hidden, 6 NC hidden, 7 NC hidden, 8 NC hidden, 9 DIAG/EN, 10 NC hidden, 11 CPOUT, 12 SENSE3, 13 IN2, 14 EN2, 15 CP-, 16 EN3, 17 VBOOT, 18 NC hidden, 19 OUT3, 20 VSB, 21 GND, 22 VSA, 23 OUT2, 24 VCP, 25 SENSE2, 26 IN1, 27 EN1, 28 IN3, 29 SENSE1, 30 CP+, 31 OUT1, 32 NC hidden

## LCD20x4A
designator LCD, comment LCD 20x4A
LCD dipslay 20 char, 4 line; Value: Jum 40; Value: LCD 20x4A
footprint LCD20X4A (LCD dipslay 20x4, 16 pin)
pins: 1 GND, 2 VDD, 3 VSS, 4 RS, 5 R/~{W}, 6 ~{EN}, 7 D0, 8 D1, 9 D2, 10 D3, 11 D4, 12 D5, 13 D6, 14 D7, 15 A, 16 K

## LDS6200
designator U?
footprint TQFN-16 (pitch 0.5 3x3mm)
pins: 1 C3, 2 C2, 3 C1, 4 C0, 5 SHIELD, 6 TEST1, 7 RESETB, 8 INTB, 9 SDA, 10 SCLK, 11 GPIO, 12 VDD, 13 VDIO, 14 LDOEN, 15 VSS, 16 TEST0

## LED
designator LED?
Typical INFRARED GaAs LED; Published: 8-Jun-2000; LatestRevisionDate: 08-Jul-2005; LatestRevisionNote: Mech Layer 1 removed.; PackageReference: LED-0; Publisher: Altium Limited; PackageDescription: LED; 2 Leads
footprint LED-3 (LED 2 PIN, 3ly Only colour)
footprint LED-5-BLUE (LED 2 PIN, 5 ly , Only colour, pin to pin 110mil)
footprint LED-5-Green (LED 2 PIN, 5 ly , Only colour,pin to pin 100mil)
footprint LED-5-RED (LED 2 PIN, 5 ly , Only colour,pin to pin 100mil)
footprint LED-5-WHITE (LED 2 PIN, 5 ly , Only colour, pin to pin 110mil)
footprint LED-32 (LED 3 PIN, 3ly Two colour)
footprint LED-52 (LED 3 PIN, 5 ly , Two colour)
footprint LED1206-Green
footprint LED1206-Orange
footprint LED1206-Red
footprint LED1206-Yellow
footprint LED0805-Blue
footprint LED0805-Green
footprint LED0805-Orange
footprint LED0805-Red
footprint LED0805-Yellow
footprint LED-0603-RED
footprint LED-0603-WHITE
footprint LED-0603-YELLOW
footprint LED_SINO
pins: 1 A, 2 K

## LED 7
designator LED 7
7.62 mm HER 7-Segment Display: CA, RH DP; Note: Pins 3 and 14 are redundant Anodes.; Note: No pins are present in positions 4, 5 and 12.; Published: 26-May-2004; LatestRevisionDate: 11-Oct-2004; LatestRevisionNote: Display outline superimposed on PCB Footprint.; DatasheetVersion: 27-Aug-2001; PackageVersion: 10-Mar-2001; PackageReference: A-11(R); Publisher: Altium Limited; PackageDescription: LED, 7-Segment Display, 7.62 mm, RHD; 14 Leads (3 Absent); Row Space 7.62 mm; Pitch 2.54 mm; ComponentLink1Description: Manufacturer Link; ComponentLink1URL: http://www.avagotech.com/; ComponentLink2Description: Datasheet; ComponentLink2URL: http://cp.literature.agilent.com/litweb/pdf/5988-3325EN.pdf
footprint LED 7 Seg 5 inch (LED 7 5 inch)
pins: 1 A "Anode", 2 E "Cathode", 3 D "Cathode", 4 C "Cathode", 5 DP "Cathode", 6 B "Cathode", 7 A "Cathode", 8 A "Anode", 9 F "Cathode", 10 G "Cathode"

## LED 7 0.39
designator LED?
footprint LED 7 0.39
pins: 1 A1 "Digit 1 Common Anode", 2 A2 "Digit 2 Common Anode", 3 d "Digits (1-4) d Cathode", 4 D123, 5 e "Digits (1-4) e Cathode", 6 A3 "Digit 3 Common Anode", 7 DP "Digits (2,3) DP Cathode", 8 A4 "Digit 4 Common Anode", 9 NC, 10 NC, 11 f "Digits (1-4) f Cathode", 12 NC, 13 c "Digits (1-4) c Cathode", 14 a "Digits (1-4) a Cathode", 15 g "Digits (1-4) g Cathode", 16 b "Digits (1-4) b Cathode"
text: DIG1; DIG2; DIG3; DIG4; DP3; DP2

## LED 7 .28
designator LED?, comment LED 7  0.28
footprint LEDDIP-12/QUAD (LED, 7-Segment Display, 7 mm, Four Digit, 88:88)
pins: 1 e "Digits (1-4) e Cathode", 2 d "Digits (1-4) d Cathode", 3 DP "Digits (2,3) DP Cathode", 4 c "Digits (1-4) c Cathode", 5 g "Digits (1-4) g Cathode", 6 A4 "Digit 4 Common Anode", 7 b "Digits (1-4) b Cathode", 8 A3 "Digit 3 Common Anode", 9 A2 "Digit 2 Common Anode", 10 f "Digits (1-4) f Cathode", 11 a "Digits (1-4) a Cathode", 12 A1 "Digit 1 Common Anode"
text: DIG1; DIG2; DIG3; DIG4; DP3; DP2

## LEDRGB
designator LED?
Typical INFRARED GaAs LED; Published: 8-Jun-2000; LatestRevisionDate: 08-Jul-2005; LatestRevisionNote: Mech Layer 1 removed.; PackageReference: LED-0; Publisher: Altium Limited; PackageDescription: LED; 2 Leads
footprint LED-RGB-5050
footprint LED-RGB-3W
footprint LED-RGB-5050
pins: 1 A, 2 K, 3 A, 4 K, 5 A, 6 K
text: R; G; B

## LM78xx
designator IC?, comment LM7805
On ap +, from + 5 to + 24VDC; Value: LM7805
footprint TO252
pins: 1 IN, 2 GND, 3 OUT

## LM79xx
designator IC?, comment LM7905
On ap -, from - 5 to - 24VDC; Value: LM7905
footprint QTO-220 (TO-220 - 1-2-3)
footprint QTO-220H3 (TO-220 1-2-3)
footprint QTO-220NH (TO-220 - 1-2-3)
pins: 1 GND, 2 IN, 3 OUT

## LM324
designator IC?
Low-Power Dual Operational Amplifier; Value: LM358
footprint SOIC14 (Small Outline; 14 Leads; Body Width 3.9 mm; Pitch 1.27 mm)
part A pins: 1 OUT, 2 IN-, 3 IN+, 4 VCC, 11 GND
part B pins: 5 IN+, 6 IN-, 7 OUT
part C pins: 8 OUT, 9 IN-, 10 IN+
part D pins: 12 IN+, 13 IN-, 14 OUT

## LM358
designator IC?
Low-Power Dual Operational Amplifier; Value: LM358
footprint SOP8 (SOIC, 8-Leads, Body 4.9x3.9mm, Pitch 1.27mm, IPC High Density)
part A pins: 1 OUT, 2 IN-, 3 IN+, 4 -V, 8 +V
part B pins: 5 IN+, 6 IN-, 7 OUT

## LM1117
designator IC?
3v3; Value: LM317
footprint SOT223-4N (SOT223, 4-Leads, Body 6.5x3.5mm, Pitch 2.3mm, Lead Span 7mm, IPC Medium Density)
footprint SOT223-4N (SOT223, 4-Leads, Body 6.5x3.5mm, Pitch 2.3mm, Lead Span 7mm, IPC Medium Density)
pins: 1 ADJ/G, 2 OUT, 3 IN, 4 Tab

## LM2576T-5.0
designator U?
SIMPLE SWITCHER; 3A Step-Down Voltage Regulator; PartNumber: LM2576T-5.0; Manufacturer: National Semiconductor; PackageTopMarking: NSUZXYTT*LM2576T*-5.0 P+; PowerWise: N; FirstPublished: 4-Dec-2008; DatasheetVersion: Aug-2004; PackageVersion: revJ, Jan-1992; PackageReference: T05A; Publisher: Altium Limited; PackageDescription: TO-220, Molded, 5 Lead, Straight; CompType: Switcher; RoHS: O; PinCount: 5; DigiKeyPartNumber: LM2576T-5.0-ND; Code_JEDEC: TO-220-AB; ComponentLink1Description: LM2576 Datasheet; ComponentLink1URL: http://www.national.com/ds/LM/LM2576.pdf; ComponentLink2Description: LM2576 Web Page; ComponentLink2URL: http://www.national.com/pf/LM/LM2576.html; ComponentLink3Description: T05A Package Page; ComponentLink3URL: http://www.national.com/packaging/folders/t05a.html
footprint LM2576t
footprint LM2596-SMD
pins: 1 VIN (power), 2 OUT (power), 3 GND (power), 4 FB (in), 5 ~{ON}/OFF (in)

## LM2622
designator U?
600kHz/1.3MHz Step-up PWM DC/DC Converter
footprint LM2622 (TSOP, 8-Leads, Body 3.10x3.10mm, Pitch 0.65mm, Thermal Pad 0.00.2x0.00.2mm, IPC Medium Density)
pins: 1 Vc, 2 FB, 3 ~{SHDN}, 4 DND, 5 SW, 6 Vin, 7 FSLCT, 8 NC hidden

## LNK304
designator U?, comment U?  (value not drawn)
footprint DIP7 (7 PIN, W 300mil, Pin to pin 100mil)
footprint DIP7 - SMD (7 PIN, W 300mil, Pin to pin 100mil)
pins: 1 S, 2 S, 3 BP, 4 FB, 5 D, 7 S, 8 S

## LNK306DN
designator U?
footprint SOC7 (SOIC, 7-Leads, Body 4.9x3.9mm, Pitch 1.27mm, IPC High Density)
pins: 1 BP, 2 FB, 4 D, 5 S, 6 S, 7 S, 8 S
